# Altium schematic symbol library jlcpcb_2025_04_capacitors_extended_1206.schlib: 2503 symbols (part 3 of 14) (continued)
## 1206N471J500CT
designator C?  Capacitance: 470pF  (hidden comment: *)
Capacitor, Ceramic (MLCC), 470pF, ±5%, 50V, NP0, ±5%, SMD 1206; Manufacturer: Walsin Tech Corp; Manufacturer Part Number: 1206N471J500CT; Package Size: 1206; JLCPCB Basic Part: No; JLCPCB Part Number: C396806; Supplier 1: LCSC; Category: Capacitors - MLCC; Supplier Part Number 1: C396806; Tolerance: ±5%; Voltage Rating: 50V; Temperature Coefficient: NP0; RoHS: Yes; ComponentLink1Description: Datasheet; ComponentLink1URL: https://wmsc.lcsc.com/wmsc/upload/file/pdf/v2/lcsc/2304140030_Walsin-Tech-Corp-1206N471J500CT_C396806.pdf; ComponentLink2Description: JLCPCB Part URL; ComponentLink2URL: https://jlcpcb.com/partdetail/C396806; ComponentLink3Description: LCSC Part URL; ComponentLink3URL: https://lcsc.com/product-detail/Multilayer-Ceramic-Capacitors-MLCC---SMD-SMT_Walsin-Tech-Corp-Walsin-Tech-Corp-1206N471J500CT_C396806.html
footprint CAP-1206 (1206 (3216M) Capacitor)
pins: 1, 2

## 1206N471J501CT
designator C?  Capacitance: 470pF  (hidden comment: *)
Capacitor, Ceramic (MLCC), 470pF, ±5%, 500V, C0G, ±5%, SMD 1206; Manufacturer: Walsin Tech Corp; Manufacturer Part Number: 1206N471J501CT; Package Size: 1206; JLCPCB Basic Part: No; JLCPCB Part Number: C3876989; Supplier 1: LCSC; Category: Capacitors - MLCC; Supplier Part Number 1: C3876989; Tolerance: ±5%; Voltage Rating: 500V; Temperature Coefficient: C0G; RoHS: Yes; ComponentLink1Description: Datasheet; ComponentLink1URL: https://wmsc.lcsc.com/wmsc/upload/file/pdf/v2/lcsc/2401181530_Walsin-Tech-Corp-1206N471J501CT_C3876989.pdf; ComponentLink2Description: JLCPCB Part URL; ComponentLink2URL: https://jlcpcb.com/partdetail/C3876989; ComponentLink3Description: LCSC Part URL; ComponentLink3URL: https://lcsc.com/product-detail/Multilayer-Ceramic-Capacitors-MLCC---SMD-SMT_Walsin-Tech-Corp-Walsin-Tech-Corp-1206N471J501CT_C3876989.html
footprint CAP-1206 (1206 (3216M) Capacitor)
pins: 1, 2

## 1206N471J631CT
designator C?  Capacitance: 470pF  (hidden comment: *)
Capacitor, Ceramic (MLCC), 470pF, ±5%, 630V, NP0, ±5%, SMD 1206; Manufacturer: Walsin Tech Corp; Manufacturer Part Number: 1206N471J631CT; Package Size: 1206; JLCPCB Basic Part: No; JLCPCB Part Number: C509276; Supplier 1: LCSC; Category: Capacitors - MLCC; Supplier Part Number 1: C509276; Tolerance: ±5%; Voltage Rating: 630V; Temperature Coefficient: NP0; RoHS: Yes; ComponentLink1Description: Datasheet; ComponentLink1URL: https://wmsc.lcsc.com/wmsc/upload/file/pdf/v2/lcsc/2304140030_Walsin-Tech-Corp-1206N471J631CT_C509276.pdf; ComponentLink2Description: JLCPCB Part URL; ComponentLink2URL: https://jlcpcb.com/partdetail/C509276; ComponentLink3Description: LCSC Part URL; ComponentLink3URL: https://lcsc.com/product-detail/Multilayer-Ceramic-Capacitors-MLCC---SMD-SMT_Walsin-Tech-Corp-Walsin-Tech-Corp-1206N471J631CT_C509276.html
footprint CAP-1206 (1206 (3216M) Capacitor)
pins: 1, 2

## 1206N472F500CT
designator C?  Capacitance: 4.7nF  (hidden comment: *)
Capacitor, Ceramic (MLCC), 4.7nF, ±1%, 50V, C0G, ±1%, SMD 1206; Manufacturer: Walsin Tech Corp; Manufacturer Part Number: 1206N472F500CT; Package Size: 1206; JLCPCB Basic Part: No; JLCPCB Part Number: C3876583; Supplier 1: LCSC; Category: Capacitors - MLCC; Supplier Part Number 1: C3876583; Tolerance: ±1%; Voltage Rating: 50V; Temperature Coefficient: C0G; RoHS: Yes; ComponentLink1Description: Datasheet; ComponentLink1URL: https://wmsc.lcsc.com/wmsc/upload/file/pdf/v2/lcsc/2401181529_Walsin-Tech-Corp-1206N472F500CT_C3876583.pdf; ComponentLink2Description: JLCPCB Part URL; ComponentLink2URL: https://jlcpcb.com/partdetail/C3876583; ComponentLink3Description: LCSC Part URL; ComponentLink3URL: https://lcsc.com/product-detail/Multilayer-Ceramic-Capacitors-MLCC---SMD-SMT_Walsin-Tech-Corp-Walsin-Tech-Corp-1206N472F500CT_C3876583.html
footprint CAP-1206 (1206 (3216M) Capacitor)
pins: 1, 2

## 1206N472J500CT
designator C?  Capacitance: 4.7nF  (hidden comment: *)
Capacitor, Ceramic (MLCC), 4.7nF, ±5%, 50V, NP0, ±5%, SMD 1206; Manufacturer: Walsin Tech Corp; Manufacturer Part Number: 1206N472J500CT; Package Size: 1206; JLCPCB Basic Part: No; JLCPCB Part Number: C525506; Supplier 1: LCSC; Category: Capacitors - MLCC; Supplier Part Number 1: C525506; Tolerance: ±5%; Voltage Rating: 50V; Temperature Coefficient: NP0; RoHS: Yes; ComponentLink1Description: Datasheet; ComponentLink1URL: https://wmsc.lcsc.com/wmsc/upload/file/pdf/v2/lcsc/2304140030_Walsin-Tech-Corp-1206N472J500CT_C525506.pdf; ComponentLink2Description: JLCPCB Part URL; ComponentLink2URL: https://jlcpcb.com/partdetail/C525506; ComponentLink3Description: LCSC Part URL; ComponentLink3URL: https://lcsc.com/product-detail/Multilayer-Ceramic-Capacitors-MLCC---SMD-SMT_Walsin-Tech-Corp-Walsin-Tech-Corp-1206N472J500CT_C525506.html
footprint CAP-1206 (1206 (3216M) Capacitor)
pins: 1, 2

## 1206N560J102CT
designator C?  Capacitance: 56pF  (hidden comment: *)
Capacitor, Ceramic (MLCC), 56pF, ±5%, 1kV, NP0, ±5%, SMD 1206; Manufacturer: Walsin Tech Corp; Manufacturer Part Number: 1206N560J102CT; Package Size: 1206; JLCPCB Basic Part: No; JLCPCB Part Number: C384717; Supplier 1: LCSC; Category: Capacitors - MLCC; Supplier Part Number 1: C384717; Tolerance: ±5%; Voltage Rating: 1kV; Temperature Coefficient: NP0; RoHS: Yes; ComponentLink1Description: Datasheet; ComponentLink1URL: https://wmsc.lcsc.com/wmsc/upload/file/pdf/v2/lcsc/2304140030_Walsin-Tech-Corp-1206N560J102CT_C384717.pdf; ComponentLink2Description: JLCPCB Part URL; ComponentLink2URL: https://jlcpcb.com/partdetail/C384717; ComponentLink3Description: LCSC Part URL; ComponentLink3URL: https://lcsc.com/product-detail/Multilayer-Ceramic-Capacitors-MLCC---SMD-SMT_Walsin-Tech-Corp-Walsin-Tech-Corp-1206N560J102CT_C384717.html
footprint CAP-1206 (1206 (3216M) Capacitor)
pins: 1, 2

## 1206N560J501CT
designator C?  Capacitance: 56pF  (hidden comment: *)
Capacitor, Ceramic (MLCC), 56pF, ±5%, 500V, NP0, ±5%, SMD 1206; Manufacturer: Walsin Tech Corp; Manufacturer Part Number: 1206N560J501CT; Package Size: 1206; JLCPCB Basic Part: No; JLCPCB Part Number: C152950; Supplier 1: LCSC; Category: Capacitors - MLCC; Supplier Part Number 1: C152950; Tolerance: ±5%; Voltage Rating: 500V; Temperature Coefficient: NP0; RoHS: Yes; ComponentLink1Description: Datasheet; ComponentLink1URL: https://wmsc.lcsc.com/wmsc/upload/file/pdf/v2/lcsc/2304140030_Walsin-Tech-Corp-1206N560J501CT_C152950.pdf; ComponentLink2Description: JLCPCB Part URL; ComponentLink2URL: https://jlcpcb.com/partdetail/C152950; ComponentLink3Description: LCSC Part URL; ComponentLink3URL: https://lcsc.com/product-detail/Multilayer-Ceramic-Capacitors-MLCC---SMD-SMT_Walsin-Tech-Corp-Walsin-Tech-Corp-1206N560J501CT_C152950.html
footprint CAP-1206 (1206 (3216M) Capacitor)
pins: 1, 2

## 1206N561J102CT
designator C?  Capacitance: 560pF  (hidden comment: *)
Capacitor, Ceramic (MLCC), 560pF, ±5%, 1kV, NP0, ±5%, SMD 1206; Manufacturer: Walsin Tech Corp; Manufacturer Part Number: 1206N561J102CT; Package Size: 1206; JLCPCB Basic Part: No; JLCPCB Part Number: C396807; Supplier 1: LCSC; Category: Capacitors - MLCC; Supplier Part Number 1: C396807; Tolerance: ±5%; Voltage Rating: 1kV; Temperature Coefficient: NP0; RoHS: Yes; ComponentLink1Description: Datasheet; ComponentLink1URL: https://wmsc.lcsc.com/wmsc/upload/file/pdf/v2/lcsc/2304140030_Walsin-Tech-Corp-1206N561J102CT_C396807.pdf; ComponentLink2Description: JLCPCB Part URL; ComponentLink2URL: https://jlcpcb.com/partdetail/C396807; ComponentLink3Description: LCSC Part URL; ComponentLink3URL: https://lcsc.com/product-detail/Multilayer-Ceramic-Capacitors-MLCC---SMD-SMT_Walsin-Tech-Corp-Walsin-Tech-Corp-1206N561J102CT_C396807.html
footprint CAP-1206 (1206 (3216M) Capacitor)
pins: 1, 2

## 1206N561J631CT
designator C?  Capacitance: 560pF  (hidden comment: *)
Capacitor, Ceramic (MLCC), 560pF, ±5%, 630V, NP0, ±5%, SMD 1206; Manufacturer: Walsin Tech Corp; Manufacturer Part Number: 1206N561J631CT; Package Size: 1206; JLCPCB Basic Part: No; JLCPCB Part Number: C2894199; Supplier 1: LCSC; Category: Capacitors - MLCC; Supplier Part Number 1: C2894199; Tolerance: ±5%; Voltage Rating: 630V; Temperature Coefficient: NP0; RoHS: Yes; ComponentLink1Description: Datasheet; ComponentLink1URL: https://wmsc.lcsc.com/wmsc/upload/file/pdf/v2/lcsc/2109081830_Walsin-Tech-Corp-1206N561J631CT_C2894199.pdf; ComponentLink2Description: JLCPCB Part URL; ComponentLink2URL: https://jlcpcb.com/partdetail/C2894199; ComponentLink3Description: LCSC Part URL; ComponentLink3URL: https://lcsc.com/product-detail/Multilayer-Ceramic-Capacitors-MLCC---SMD-SMT_Walsin-Tech-Corp-Walsin-Tech-Corp-1206N561J631CT_C2894199.html
footprint CAP-1206 (1206 (3216M) Capacitor)
pins: 1, 2

## 1206N680J102CT
designator C?  Capacitance: 68pF  (hidden comment: *)
Capacitor, Ceramic (MLCC), 68pF, ±5%, 1kV, NP0, ±5%, SMD 1206; Manufacturer: Walsin Tech Corp; Manufacturer Part Number: 1206N680J102CT; Package Size: 1206; JLCPCB Basic Part: No; JLCPCB Part Number: C303970; Supplier 1: LCSC; Category: Capacitors - MLCC; Supplier Part Number 1: C303970; Tolerance: ±5%; Voltage Rating: 1kV; Temperature Coefficient: NP0; RoHS: Yes; ComponentLink1Description: Datasheet; ComponentLink1URL: https://wmsc.lcsc.com/wmsc/upload/file/pdf/v2/lcsc/2304231850_Walsin-Tech-Corp-1206N680J102CT_C303970.pdf; ComponentLink2Description: JLCPCB Part URL; ComponentLink2URL: https://jlcpcb.com/partdetail/C303970; ComponentLink3Description: LCSC Part URL; ComponentLink3URL: https://lcsc.com/product-detail/Multilayer-Ceramic-Capacitors-MLCC---SMD-SMT_Walsin-Tech-Corp-Walsin-Tech-Corp-1206N680J102CT_C303970.html
footprint CAP-1206 (1206 (3216M) Capacitor)
pins: 1, 2

## 1206N680J201CT
designator C?  Capacitance: 68pF  (hidden comment: *)
Capacitor, Ceramic (MLCC), 68pF, ±5%, 200V, NP0, ±5%, SMD 1206; Manufacturer: Walsin Tech Corp; Manufacturer Part Number: 1206N680J201CT; Package Size: 1206; JLCPCB Basic Part: No; JLCPCB Part Number: C396808; Supplier 1: LCSC; Category: Capacitors - MLCC; Supplier Part Number 1: C396808; Tolerance: ±5%; Voltage Rating: 200V; Temperature Coefficient: NP0; RoHS: Yes; ComponentLink1Description: Datasheet; ComponentLink1URL: https://wmsc.lcsc.com/wmsc/upload/file/pdf/v2/lcsc/2304140030_Walsin-Tech-Corp-1206N680J201CT_C396808.pdf; ComponentLink2Description: JLCPCB Part URL; ComponentLink2URL: https://jlcpcb.com/partdetail/C396808; ComponentLink3Description: LCSC Part URL; ComponentLink3URL: https://lcsc.com/product-detail/Multilayer-Ceramic-Capacitors-MLCC---SMD-SMT_Walsin-Tech-Corp-Walsin-Tech-Corp-1206N680J201CT_C396808.html
footprint CAP-1206 (1206 (3216M) Capacitor)
pins: 1, 2

## 1206N680J202CT
designator C?  Capacitance: 68pF  (hidden comment: *)
Capacitor, Ceramic (MLCC), 68pF, ±5%, 2kV, NP0, ±5%, SMD 1206; Manufacturer: Walsin Tech Corp; Manufacturer Part Number: 1206N680J202CT; Package Size: 1206; JLCPCB Basic Part: No; JLCPCB Part Number: C77531; Supplier 1: LCSC; Category: Capacitors - MLCC; Supplier Part Number 1: C77531; Tolerance: ±5%; Voltage Rating: 2kV; Temperature Coefficient: NP0; RoHS: Yes; ComponentLink1Description: Datasheet; ComponentLink2Description: JLCPCB Part URL; ComponentLink2URL: https://jlcpcb.com/partdetail/C77531; ComponentLink3Description: LCSC Part URL; ComponentLink3URL: https://lcsc.com/product-detail/Multilayer-Ceramic-Capacitors-MLCC---SMD-SMT_Walsin-Tech-Corp-Walsin-Tech-Corp-1206N680J202CT_C77531.html
footprint CAP-1206 (1206 (3216M) Capacitor)
pins: 1, 2

## 1206N680J500CT
designator C?  Capacitance: 68pF  (hidden comment: *)
Capacitor, Ceramic (MLCC), 68pF, ±5%, 50V, NP0, ±5%, SMD 1206; Manufacturer: Walsin Tech Corp; Manufacturer Part Number: 1206N680J500CT; Package Size: 1206; JLCPCB Basic Part: No; JLCPCB Part Number: C237230; Supplier 1: LCSC; Category: Capacitors - MLCC; Supplier Part Number 1: C237230; Tolerance: ±5%; Voltage Rating: 50V; Temperature Coefficient: NP0; RoHS: Yes; ComponentLink1Description: Datasheet; ComponentLink1URL: https://wmsc.lcsc.com/wmsc/upload/file/pdf/v2/lcsc/2304140030_Walsin-Tech-Corp-1206N680J500CT_C237230.pdf; ComponentLink2Description: JLCPCB Part URL; ComponentLink2URL: https://jlcpcb.com/partdetail/C237230; ComponentLink3Description: LCSC Part URL; ComponentLink3URL: https://lcsc.com/product-detail/Multilayer-Ceramic-Capacitors-MLCC---SMD-SMT_Walsin-Tech-Corp-Walsin-Tech-Corp-1206N680J500CT_C237230.html
footprint CAP-1206 (1206 (3216M) Capacitor)
pins: 1, 2

## 1206N681J102CT
designator C?  Capacitance: 680pF  (hidden comment: *)
Capacitor, Ceramic (MLCC), 680pF, ±5%, 1kV, NP0, ±5%, SMD 1206; Manufacturer: Walsin Tech Corp; Manufacturer Part Number: 1206N681J102CT; Package Size: 1206; JLCPCB Basic Part: No; JLCPCB Part Number: C384716; Supplier 1: LCSC; Category: Capacitors - MLCC; Supplier Part Number 1: C384716; Tolerance: ±5%; Voltage Rating: 1kV; Temperature Coefficient: NP0; RoHS: Yes; ComponentLink1Description: Datasheet; ComponentLink1URL: https://wmsc.lcsc.com/wmsc/upload/file/pdf/v2/lcsc/2304140030_Walsin-Tech-Corp-1206N681J102CT_C384716.pdf; ComponentLink2Description: JLCPCB Part URL; ComponentLink2URL: https://jlcpcb.com/partdetail/C384716; ComponentLink3Description: LCSC Part URL; ComponentLink3URL: https://lcsc.com/product-detail/Multilayer-Ceramic-Capacitors-MLCC---SMD-SMT_Walsin-Tech-Corp-Walsin-Tech-Corp-1206N681J102CT_C384716.html
footprint CAP-1206 (1206 (3216M) Capacitor)
pins: 1, 2

## 1206N681J501CT
designator C?  Capacitance: 680pF  (hidden comment: *)
Capacitor, Ceramic (MLCC), 680pF, ±5%, 500V, C0G, ±5%, SMD 1206; Manufacturer: Walsin Tech Corp; Manufacturer Part Number: 1206N681J501CT; Package Size: 1206; JLCPCB Basic Part: No; JLCPCB Part Number: C3832856; Supplier 1: LCSC; Category: Capacitors - MLCC; Supplier Part Number 1: C3832856; Tolerance: ±5%; Voltage Rating: 500V; Temperature Coefficient: C0G; RoHS: Yes; ComponentLink1Description: Datasheet; ComponentLink1URL: https://wmsc.lcsc.com/wmsc/upload/file/pdf/v2/lcsc/2401181513_Walsin-Tech-Corp-1206N681J501CT_C3832856.pdf; ComponentLink2Description: JLCPCB Part URL; ComponentLink2URL: https://jlcpcb.com/partdetail/C3832856; ComponentLink3Description: LCSC Part URL; ComponentLink3URL: https://lcsc.com/product-detail/Multilayer-Ceramic-Capacitors-MLCC---SMD-SMT_Walsin-Tech-Corp-Walsin-Tech-Corp-1206N681J501CT_C3832856.html
footprint CAP-1206 (1206 (3216M) Capacitor)
pins: 1, 2

## 1206N820J102CT
designator C?  Capacitance: 82pF  (hidden comment: *)
Capacitor, Ceramic (MLCC), 82pF, ±5%, 1kV, NP0, ±5%, SMD 1206; Manufacturer: Walsin Tech Corp; Manufacturer Part Number: 1206N820J102CT; Package Size: 1206; JLCPCB Basic Part: No; JLCPCB Part Number: C396810; Supplier 1: LCSC; Category: Capacitors - MLCC; Supplier Part Number 1: C396810; Tolerance: ±5%; Voltage Rating: 1kV; Temperature Coefficient: NP0; RoHS: Yes; ComponentLink1Description: Datasheet; ComponentLink1URL: https://wmsc.lcsc.com/wmsc/upload/file/pdf/v2/lcsc/2304140030_Walsin-Tech-Corp-1206N820J102CT_C396810.pdf; ComponentLink2Description: JLCPCB Part URL; ComponentLink2URL: https://jlcpcb.com/partdetail/C396810; ComponentLink3Description: LCSC Part URL; ComponentLink3URL: https://lcsc.com/product-detail/Multilayer-Ceramic-Capacitors-MLCC---SMD-SMT_Walsin-Tech-Corp-Walsin-Tech-Corp-1206N820J102CT_C396810.html
footprint CAP-1206 (1206 (3216M) Capacitor)
pins: 1, 2

## 1206N822J500CT
designator C?  Capacitance: 8.2nF  (hidden comment: *)
Capacitor, Ceramic (MLCC), 8.2nF, ±5%, 50V, NP0, ±5%, SMD 1206; Manufacturer: Walsin Tech Corp; Manufacturer Part Number: 1206N822J500CT; Package Size: 1206; JLCPCB Basic Part: No; JLCPCB Part Number: C303971; Supplier 1: LCSC; Category: Capacitors - MLCC; Supplier Part Number 1: C303971; Tolerance: ±5%; Voltage Rating: 50V; Temperature Coefficient: NP0; RoHS: Yes; ComponentLink1Description: Datasheet; ComponentLink1URL: https://wmsc.lcsc.com/wmsc/upload/file/pdf/v2/lcsc/2304140030_Walsin-Tech-Corp-1206N822J500CT_C303971.pdf; ComponentLink2Description: JLCPCB Part URL; ComponentLink2URL: https://jlcpcb.com/partdetail/C303971; ComponentLink3Description: LCSC Part URL; ComponentLink3URL: https://lcsc.com/product-detail/Multilayer-Ceramic-Capacitors-MLCC---SMD-SMT_Walsin-Tech-Corp-Walsin-Tech-Corp-1206N822J500CT_C303971.html
footprint CAP-1206 (1206 (3216M) Capacitor)
pins: 1, 2

## 1206X106K6R3NT
designator C?  Capacitance: 10uF  (hidden comment: *)
Capacitor, Ceramic (MLCC), 10uF, ±10%, 6.3V, X5R, ±10%, SMD 1206; Manufacturer: FH (Guangdong Fenghua Advanced Tech); Manufacturer Part Number: 1206X106K6R3NT; Package Size: 1206; JLCPCB Basic Part: No; JLCPCB Part Number: C3037669; Supplier 1: LCSC; Category: Capacitors - MLCC; Supplier Part Number 1: C3037669; Tolerance: ±10%; Voltage Rating: 6.3V; Temperature Coefficient: X5R; RoHS: Yes; ComponentLink1Description: Datasheet; ComponentLink1URL: https://wmsc.lcsc.com/wmsc/upload/file/pdf/v2/lcsc/2206171645_FH--Guangdong-Fenghua-Advanced-Tech-1206X106K6R3NT_C3037669.pdf; ComponentLink2Description: JLCPCB Part URL; ComponentLink2URL: https://jlcpcb.com/partdetail/C3037669; ComponentLink3Description: LCSC Part URL; ComponentLink3URL: https://lcsc.com/product-detail/Multilayer-Ceramic-Capacitors-MLCC---SMD-SMT_FH-Guangdong-Fenghua-Advanced-Tech-FH-Guangdong-Fenghua-Advanced-Tech-1206X106K6R3NT_C3037669.html
footprint CAP-1206 (1206 (3216M) Capacitor)
pins: 1, 2

## 1206X106K100
designator C?  Capacitance: 10uF  (hidden comment: *)
Capacitor, Ceramic (MLCC), 10uF, ±10%, 10V, X5R, ±10%, SMD 1206; Manufacturer: Walsin Tech Corp; Manufacturer Part Number: 1206X106K100; Package Size: 1206; JLCPCB Basic Part: No; JLCPCB Part Number: C152991; Supplier 1: LCSC; Category: Capacitors - MLCC; Supplier Part Number 1: C152991; Tolerance: ±10%; Voltage Rating: 10V; Temperature Coefficient: X5R; RoHS: Yes; ComponentLink1Description: Datasheet; ComponentLink1URL: https://wmsc.lcsc.com/wmsc/upload/file/pdf/v2/lcsc/2304140030_Walsin-Tech-Corp-1206X106K100_C152991.pdf; ComponentLink2Description: JLCPCB Part URL; ComponentLink2URL: https://jlcpcb.com/partdetail/C152991; ComponentLink3Description: LCSC Part URL; ComponentLink3URL: https://lcsc.com/product-detail/Multilayer-Ceramic-Capacitors-MLCC---SMD-SMT_Walsin-Tech-Corp-Walsin-Tech-Corp-1206X106K100_C152991.html
footprint CAP-1206 (1206 (3216M) Capacitor)
pins: 1, 2

## 1206X106K100CT
designator C?  Capacitance: 10uF  (hidden comment: *)
Capacitor, Ceramic (MLCC), 10uF, ±10%, 10V, X5R, ±10%, SMD 1206; Manufacturer: Walsin Tech Corp; Manufacturer Part Number: 1206X106K100CT; Package Size: 1206; JLCPCB Basic Part: No; JLCPCB Part Number: C304002; Supplier 1: LCSC; Category: Capacitors - MLCC; Supplier Part Number 1: C304002; Tolerance: ±10%; Voltage Rating: 10V; Temperature Coefficient: X5R; RoHS: Yes; ComponentLink1Description: Datasheet; ComponentLink1URL: https://wmsc.lcsc.com/wmsc/upload/file/pdf/v2/lcsc/2304140030_Walsin-Tech-Corp-1206X106K100CT_C304002.pdf; ComponentLink2Description: JLCPCB Part URL; ComponentLink2URL: https://jlcpcb.com/partdetail/C304002; ComponentLink3Description: LCSC Part URL; ComponentLink3URL: https://lcsc.com/product-detail/Multilayer-Ceramic-Capacitors-MLCC---SMD-SMT_Walsin-Tech-Corp-Walsin-Tech-Corp-1206X106K100CT_C304002.html
footprint CAP-1206 (1206 (3216M) Capacitor)
pins: 1, 2

## 1206X106K100NT
designator C?  Capacitance: 10uF  (hidden comment: *)
Capacitor, Ceramic (MLCC), 10uF, ±10%, 10V, X5R, ±10%, SMD 1206; Manufacturer: FH(Guangdong Fenghua Advanced Tech); Manufacturer Part Number: 1206X106K100NT; Package Size: 1206; JLCPCB Basic Part: No; JLCPCB Part Number: C157351; Supplier 1: LCSC; Category: Capacitors - MLCC; Supplier Part Number 1: C157351; Tolerance: ±10%; Voltage Rating: 10V; Temperature Coefficient: X5R; RoHS: Yes; ComponentLink1Description: Datasheet; ComponentLink1URL: https://wmsc.lcsc.com/wmsc/upload/file/pdf/v2/lcsc/2304140030_FH--Guangdong-Fenghua-Advanced-Tech-1206X106K100NT_C157351.pdf; ComponentLink2Description: JLCPCB Part URL; ComponentLink2URL: https://jlcpcb.com/partdetail/C157351; ComponentLink3Description: LCSC Part URL; ComponentLink3URL: https://lcsc.com/product-detail/Multilayer-Ceramic-Capacitors-MLCC---SMD-SMT_FH-Guangdong-Fenghua-Advanced-Tech-FH-Guangdong-Fenghua-Advanced-Tech-1206X106K100NT_C157351.html
footprint CAP-1206 (1206 (3216M) Capacitor)
pins: 1, 2

## 1206X106K160CT_C304003
designator C?  Capacitance: 10uF  (hidden comment: *)
Capacitor, Ceramic (MLCC), 10uF, ±10%, 16V, X5R, ±10%, SMD 1206; Manufacturer: Walsin Tech Corp; Manufacturer Part Number: 1206X106K160CT; Package Size: 1206; JLCPCB Basic Part: No; JLCPCB Part Number: C304003; Supplier 1: LCSC; Category: Capacitors - MLCC; Supplier Part Number 1: C304003; Tolerance: ±10%; Voltage Rating: 16V; Temperature Coefficient: X5R; RoHS: Yes; ComponentLink1Description: Datasheet; ComponentLink1URL: https://wmsc.lcsc.com/wmsc/upload/file/pdf/v2/lcsc/2304140030_Walsin-Tech-Corp-1206X106K160CT_C304003.pdf; ComponentLink2Description: JLCPCB Part URL; ComponentLink2URL: https://jlcpcb.com/partdetail/C304003; ComponentLink3Description: LCSC Part URL; ComponentLink3URL: https://lcsc.com/product-detail/Multilayer-Ceramic-Capacitors-MLCC---SMD-SMT_Walsin-Tech-Corp-Walsin-Tech-Corp-1206X106K160CT_C304003.html
footprint CAP-1206 (1206 (3216M) Capacitor)
pins: 1, 2

## 1206X106K160CT_C5122255
designator C?  Capacitance: 10uF  (hidden comment: *)
Capacitor, Ceramic (MLCC), 10uF, ±10%, 16V, X5R, ±10%, SMD 1206; Manufacturer: Walsin Tech Corp; Manufacturer Part Number: 1206X106K160CT; Package Size: 1206; JLCPCB Basic Part: No; JLCPCB Part Number: C5122255; Supplier 1: LCSC; Category: Capacitors - MLCC; Supplier Part Number 1: C5122255; Tolerance: ±10%; Voltage Rating: 16V; Temperature Coefficient: X5R; RoHS: Yes; ComponentLink1Description: Datasheet; ComponentLink1URL: https://wmsc.lcsc.com/wmsc/upload/file/pdf/v2/lcsc/2208151830_Walsin-Tech-Corp-1206X106K160CT_C5122255.pdf; ComponentLink2Description: JLCPCB Part URL; ComponentLink2URL: https://jlcpcb.com/partdetail/C5122255; ComponentLink3Description: LCSC Part URL; ComponentLink3URL: https://lcsc.com/product-detail/Multilayer-Ceramic-Capacitors-MLCC---SMD-SMT_Walsin-Tech-Corp-Walsin-Tech-Corp-1206X106K160CT_C5122255.html
footprint CAP-1206 (1206 (3216M) Capacitor)
pins: 1, 2

## 1206X106K160NT
designator C?  Capacitance: 10uF  (hidden comment: *)
Capacitor, Ceramic (MLCC), 10uF, ±10%, 16V, X5R, ±10%, SMD 1206; Manufacturer: FH(Guangdong Fenghua Advanced Tech); Manufacturer Part Number: 1206X106K160NT; Package Size: 1206; JLCPCB Basic Part: No; JLCPCB Part Number: C105478; Supplier 1: LCSC; Category: Capacitors - MLCC; Supplier Part Number 1: C105478; Tolerance: ±10%; Voltage Rating: 16V; Temperature Coefficient: X5R; RoHS: Yes; ComponentLink1Description: Datasheet; ComponentLink1URL: https://wmsc.lcsc.com/wmsc/upload/file/pdf/v2/lcsc/2304140030_FH--Guangdong-Fenghua-Advanced-Tech-1206X106K160NT_C105478.pdf; ComponentLink2Description: JLCPCB Part URL; ComponentLink2URL: https://jlcpcb.com/partdetail/C105478; ComponentLink3Description: LCSC Part URL; ComponentLink3URL: https://lcsc.com/product-detail/Multilayer-Ceramic-Capacitors-MLCC---SMD-SMT_FH-Guangdong-Fenghua-Advanced-Tech-FH-Guangdong-Fenghua-Advanced-Tech-1206X106K160NT_C105478.html
footprint CAP-1206 (1206 (3216M) Capacitor)
pins: 1, 2

## 1206X106K250CT
designator C?  Capacitance: 10uF  (hidden comment: *)
Capacitor, Ceramic (MLCC), 10uF, 25V, X5R, SMD 1206; Manufacturer: Walsin Tech Corp; Manufacturer Part Number: 1206X106K250CT; Package Size: 1206; JLCPCB Basic Part: No; JLCPCB Part Number: C5122252; Supplier 1: LCSC; Category: Capacitors - MLCC; Supplier Part Number 1: C5122252; Voltage Rating: 25V; Temperature Coefficient: X5R; RoHS: Yes; ComponentLink1Description: Datasheet; ComponentLink1URL: https://wmsc.lcsc.com/wmsc/upload/file/pdf/v2/lcsc/2208151830_Walsin-Tech-Corp-1206X106K250CT_C5122252.pdf; ComponentLink2Description: JLCPCB Part URL; ComponentLink2URL: https://jlcpcb.com/partdetail/C5122252; ComponentLink3Description: LCSC Part URL; ComponentLink3URL: https://lcsc.com/product-detail/Multilayer-Ceramic-Capacitors-MLCC---SMD-SMT_Walsin-Tech-Corp-Walsin-Tech-Corp-1206X106K250CT_C5122252.html
footprint CAP-1206 (1206 (3216M) Capacitor)
pins: 1, 2

## 1206X106K250NT
designator C?  Capacitance: 10uF  (hidden comment: *)
Capacitor, Ceramic (MLCC), 10uF, ±10%, 25V, X5R, ±10%, SMD 1206; Manufacturer: FH(Guangdong Fenghua Advanced Tech); Manufacturer Part Number: 1206X106K250NT; Package Size: 1206; JLCPCB Basic Part: No; JLCPCB Part Number: C105482; Supplier 1: LCSC; Category: Capacitors - MLCC; Supplier Part Number 1: C105482; Tolerance: ±10%; Voltage Rating: 25V; Temperature Coefficient: X5R; RoHS: Yes; ComponentLink1Description: Datasheet; ComponentLink1URL: https://wmsc.lcsc.com/wmsc/upload/file/pdf/v2/lcsc/2304140030_FH--Guangdong-Fenghua-Advanced-Tech-1206X106K250NT_C105482.pdf; ComponentLink2Description: JLCPCB Part URL; ComponentLink2URL: https://jlcpcb.com/partdetail/C105482; ComponentLink3Description: LCSC Part URL; ComponentLink3URL: https://lcsc.com/product-detail/Multilayer-Ceramic-Capacitors-MLCC---SMD-SMT_FH-Guangdong-Fenghua-Advanced-Tech-FH-Guangdong-Fenghua-Advanced-Tech-1206X106K250NT_C105482.html
footprint CAP-1206 (1206 (3216M) Capacitor)
pins: 1, 2

## 1206X106K500CT
designator C?  Capacitance: 10uF  (hidden comment: *)
Capacitor, Ceramic (MLCC), 10uF, ±10%, 50V, X5R, ±10%, SMD 1206; Manufacturer: Walsin Tech Corp; Manufacturer Part Number: 1206X106K500CT; Package Size: 1206; JLCPCB Basic Part: No; JLCPCB Part Number: C89835; Supplier 1: LCSC; Category: Capacitors - MLCC; Supplier Part Number 1: C89835; Tolerance: ±10%; Voltage Rating: 50V; Temperature Coefficient: X5R; RoHS: Yes; ComponentLink1Description: Datasheet; ComponentLink1URL: https://wmsc.lcsc.com/wmsc/upload/file/pdf/v2/lcsc/2304140030_Walsin-Tech-Corp-1206X106K500CT_C89835.pdf; ComponentLink2Description: JLCPCB Part URL; ComponentLink2URL: https://jlcpcb.com/partdetail/C89835; ComponentLink3Description: LCSC Part URL; ComponentLink3URL: https://lcsc.com/product-detail/Multilayer-Ceramic-Capacitors-MLCC---SMD-SMT_Walsin-Tech-Corp-Walsin-Tech-Corp-1206X106K500CT_C89835.html
footprint CAP-1206 (1206 (3216M) Capacitor)
pins: 1, 2

## 1206X106K500NT
designator C?  Capacitance: 10uF  (hidden comment: *)
Capacitor, Ceramic (MLCC), 10uF, ±10%, 50V, X5R, ±10%, SMD 1206; Manufacturer: FH(Guangdong Fenghua Advanced Tech); Manufacturer Part Number: 1206X106K500NT; Package Size: 1206; JLCPCB Basic Part: No; JLCPCB Part Number: C116702; Supplier 1: LCSC; Category: Capacitors - MLCC; Supplier Part Number 1: C116702; Tolerance: ±10%; Voltage Rating: 50V; Temperature Coefficient: X5R; RoHS: Yes; ComponentLink1Description: Datasheet; ComponentLink1URL: https://wmsc.lcsc.com/wmsc/upload/file/pdf/v2/lcsc/2304140030_FH--Guangdong-Fenghua-Advanced-Tech-1206X106K500NT_C116702.pdf; ComponentLink2Description: JLCPCB Part URL; ComponentLink2URL: https://jlcpcb.com/partdetail/C116702; ComponentLink3Description: LCSC Part URL; ComponentLink3URL: https://lcsc.com/product-detail/Multilayer-Ceramic-Capacitors-MLCC---SMD-SMT_FH-Guangdong-Fenghua-Advanced-Tech-FH-Guangdong-Fenghua-Advanced-Tech-1206X106K500NT_C116702.html
footprint CAP-1206 (1206 (3216M) Capacitor)
pins: 1, 2

## 1206X106M250NT
designator C?  Capacitance: 10uF  (hidden comment: *)
Capacitor, Ceramic (MLCC), 10uF, ±20%, 25V, X5R, ±20%, SMD 1206; Manufacturer: FH(Guangdong Fenghua Advanced Tech); Manufacturer Part Number: 1206X106M250NT; Package Size: 1206; JLCPCB Basic Part: No; JLCPCB Part Number: C93059; Supplier 1: LCSC; Category: Capacitors - MLCC; Supplier Part Number 1: C93059; Tolerance: ±20%; Voltage Rating: 25V; Temperature Coefficient: X5R; RoHS: Yes; ComponentLink1Description: Datasheet; ComponentLink1URL: https://wmsc.lcsc.com/wmsc/upload/file/pdf/v2/lcsc/2304140030_FH--Guangdong-Fenghua-Advanced-Tech-1206X106M250NT_C93059.pdf; ComponentLink2Description: JLCPCB Part URL; ComponentLink2URL: https://jlcpcb.com/partdetail/C93059; ComponentLink3Description: LCSC Part URL; ComponentLink3URL: https://lcsc.com/product-detail/Multilayer-Ceramic-Capacitors-MLCC---SMD-SMT_FH-Guangdong-Fenghua-Advanced-Tech-FH-Guangdong-Fenghua-Advanced-Tech-1206X106M250NT_C93059.html
footprint CAP-1206 (1206 (3216M) Capacitor)
pins: 1, 2

## 1206X106M500NT
designator C?  Capacitance: 10uF  (hidden comment: *)
Capacitor, Ceramic (MLCC), 10uF, ±20%, 50V, X5R, ±20%, SMD 1206; Manufacturer: FH(Guangdong Fenghua Advanced Tech); Manufacturer Part Number: 1206X106M500NT; Package Size: 1206; JLCPCB Basic Part: No; JLCPCB Part Number: C170075; Supplier 1: LCSC; Category: Capacitors - MLCC; Supplier Part Number 1: C170075; Tolerance: ±20%; Voltage Rating: 50V; Temperature Coefficient: X5R; RoHS: Yes; ComponentLink1Description: Datasheet; ComponentLink1URL: https://wmsc.lcsc.com/wmsc/upload/file/pdf/v2/lcsc/2304140030_FH--Guangdong-Fenghua-Advanced-Tech-1206X106M500NT_C170075.pdf; ComponentLink2Description: JLCPCB Part URL; ComponentLink2URL: https://jlcpcb.com/partdetail/C170075; ComponentLink3Description: LCSC Part URL; ComponentLink3URL: https://lcsc.com/product-detail/Multilayer-Ceramic-Capacitors-MLCC---SMD-SMT_FH-Guangdong-Fenghua-Advanced-Tech-FH-Guangdong-Fenghua-Advanced-Tech-1206X106M500NT_C170075.html
footprint CAP-1206 (1206 (3216M) Capacitor)
pins: 1, 2

## 1206X107M6R3CT
designator C?  Capacitance: 100uF  (hidden comment: *)
Capacitor, Ceramic (MLCC), 100uF, ±20%, 6.3V, X5R, ±20%, SMD 1206; Manufacturer: Walsin Tech Corp; Manufacturer Part Number: 1206X107M6R3CT; Package Size: 1206; JLCPCB Basic Part: No; JLCPCB Part Number: C98820; Supplier 1: LCSC; Category: Capacitors - MLCC; Supplier Part Number 1: C98820; Tolerance: ±20%; Voltage Rating: 6.3V; Temperature Coefficient: X5R; RoHS: Yes; ComponentLink1Description: Datasheet; ComponentLink1URL: https://wmsc.lcsc.com/wmsc/upload/file/pdf/v2/lcsc/2304140030_Walsin-Tech-Corp-1206X107M6R3CT_C98820.pdf; ComponentLink2Description: JLCPCB Part URL; ComponentLink2URL: https://jlcpcb.com/partdetail/C98820; ComponentLink3Description: LCSC Part URL; ComponentLink3URL: https://lcsc.com/product-detail/Multilayer-Ceramic-Capacitors-MLCC---SMD-SMT_Walsin-Tech-Corp-Walsin-Tech-Corp-1206X107M6R3CT_C98820.html
footprint CAP-1206 (1206 (3216M) Capacitor)
pins: 1, 2

## 1206X107M6R3NT
designator C?  Capacitance: 100uF  (hidden comment: *)
Capacitor, Ceramic (MLCC), 100uF, ±20%, 6.3V, X5R, ±20%, SMD 1206; Manufacturer: FH(Guangdong Fenghua Advanced Tech); Manufacturer Part Number: 1206X107M6R3NT; Package Size: 1206; JLCPCB Basic Part: No; JLCPCB Part Number: C178304; Supplier 1: LCSC; Category: Capacitors - MLCC; Supplier Part Number 1: C178304; Tolerance: ±20%; Voltage Rating: 6.3V; Temperature Coefficient: X5R; RoHS: Yes; ComponentLink1Description: Datasheet; ComponentLink1URL: https://wmsc.lcsc.com/wmsc/upload/file/pdf/v2/lcsc/2304140030_FH--Guangdong-Fenghua-Advanced-Tech-1206X107M6R3NT_C178304.pdf; ComponentLink2Description: JLCPCB Part URL; ComponentLink2URL: https://jlcpcb.com/partdetail/C178304; ComponentLink3Description: LCSC Part URL; ComponentLink3URL: https://lcsc.com/product-detail/Multilayer-Ceramic-Capacitors-MLCC---SMD-SMT_FH-Guangdong-Fenghua-Advanced-Tech-FH-Guangdong-Fenghua-Advanced-Tech-1206X107M6R3NT_C178304.html
footprint CAP-1206 (1206 (3216M) Capacitor)
pins: 1, 2

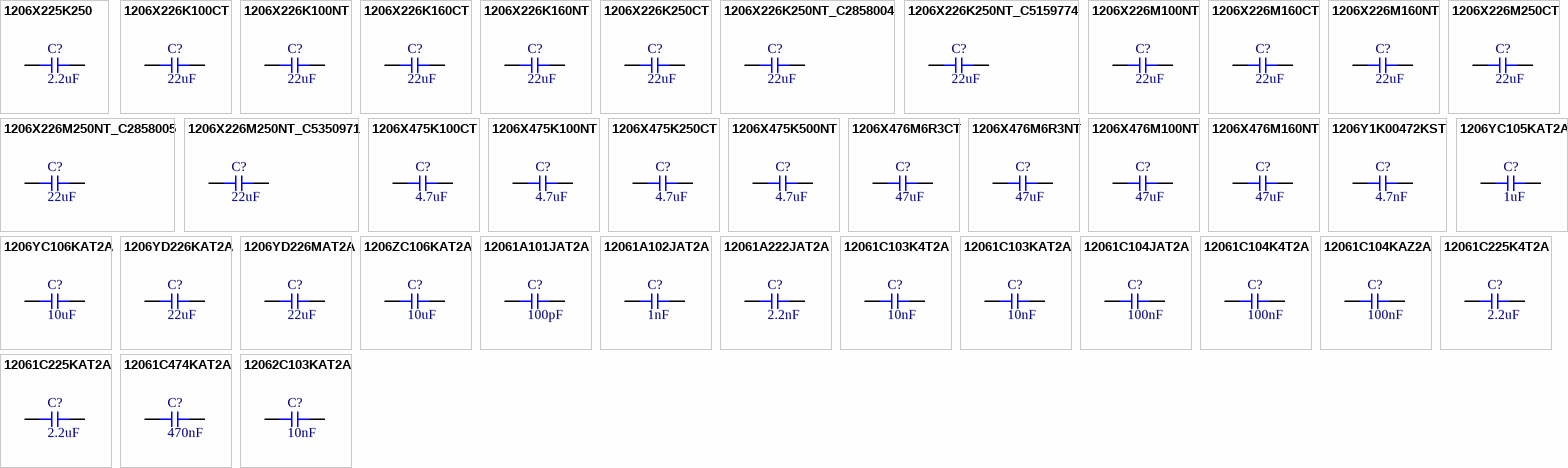
[diagram p13: symbols 1206X225K250 to 12062C103KAT2A]

## 1206X225K250
designator C?  Capacitance: 2.2uF  (hidden comment: *)
Capacitor, Ceramic (MLCC), 2.2uF, ±10%, 25V, X5R, ±10%, SMD 1206; Manufacturer: Walsin Tech Corp; Manufacturer Part Number: 1206X225K250; Package Size: 1206; JLCPCB Basic Part: No; JLCPCB Part Number: C152949; Supplier 1: LCSC; Category: Capacitors - MLCC; Supplier Part Number 1: C152949; Tolerance: ±10%; Voltage Rating: 25V; Temperature Coefficient: X5R; RoHS: Yes; ComponentLink1Description: Datasheet; ComponentLink1URL: https://wmsc.lcsc.com/wmsc/upload/file/pdf/v2/lcsc/2304140030_Walsin-Tech-Corp-1206X225K250_C152949.pdf; ComponentLink2Description: JLCPCB Part URL; ComponentLink2URL: https://jlcpcb.com/partdetail/C152949; ComponentLink3Description: LCSC Part URL; ComponentLink3URL: https://lcsc.com/product-detail/Multilayer-Ceramic-Capacitors-MLCC---SMD-SMT_Walsin-Tech-Corp-Walsin-Tech-Corp-1206X225K250_C152949.html
footprint CAP-1206 (1206 (3216M) Capacitor)
pins: 1, 2

## 1206X226K100CT
designator C?  Capacitance: 22uF  (hidden comment: *)
Capacitor, Ceramic (MLCC), 22uF, ±10%, 10V, X5R, ±10%, SMD 1206; Manufacturer: Walsin Tech Corp; Manufacturer Part Number: 1206X226K100CT; Package Size: 1206; JLCPCB Basic Part: No; JLCPCB Part Number: C304004; Supplier 1: LCSC; Category: Capacitors - MLCC; Supplier Part Number 1: C304004; Tolerance: ±10%; Voltage Rating: 10V; Temperature Coefficient: X5R; RoHS: Yes; ComponentLink1Description: Datasheet; ComponentLink1URL: https://wmsc.lcsc.com/wmsc/upload/file/pdf/v2/lcsc/2304140030_Walsin-Tech-Corp-1206X226K100CT_C304004.pdf; ComponentLink2Description: JLCPCB Part URL; ComponentLink2URL: https://jlcpcb.com/partdetail/C304004; ComponentLink3Description: LCSC Part URL; ComponentLink3URL: https://lcsc.com/product-detail/Multilayer-Ceramic-Capacitors-MLCC---SMD-SMT_Walsin-Tech-Corp-Walsin-Tech-Corp-1206X226K100CT_C304004.html
footprint CAP-1206 (1206 (3216M) Capacitor)
pins: 1, 2

## 1206X226K100NT
designator C?  Capacitance: 22uF  (hidden comment: *)
Capacitor, Ceramic (MLCC), 22uF, ±10%, 10V, X5R, ±10%, SMD 1206; Manufacturer: FH(Guangdong Fenghua Advanced Tech); Manufacturer Part Number: 1206X226K100NT; Package Size: 1206; JLCPCB Basic Part: No; JLCPCB Part Number: C1859; Supplier 1: LCSC; Category: Capacitors - MLCC; Supplier Part Number 1: C1859; Tolerance: ±10%; Voltage Rating: 10V; Temperature Coefficient: X5R; RoHS: Yes; ComponentLink1Description: Datasheet; ComponentLink1URL: https://wmsc.lcsc.com/wmsc/upload/file/pdf/v2/lcsc/2304140030_FH--Guangdong-Fenghua-Advanced-Tech-1206X226K100NT_C1859.pdf; ComponentLink2Description: JLCPCB Part URL; ComponentLink2URL: https://jlcpcb.com/partdetail/C1859; ComponentLink3Description: LCSC Part URL; ComponentLink3URL: https://lcsc.com/product-detail/Multilayer-Ceramic-Capacitors-MLCC---SMD-SMT_FH-Guangdong-Fenghua-Advanced-Tech-FH-Guangdong-Fenghua-Advanced-Tech-1206X226K100NT_C1859.html
footprint CAP-1206 (1206 (3216M) Capacitor)
pins: 1, 2

## 1206X226K160CT
designator C?  Capacitance: 22uF  (hidden comment: *)
Capacitor, Ceramic (MLCC), 22uF, X5R, SMD 1206; Manufacturer: Walsin Tech Corp; Manufacturer Part Number: 1206X226K160CT; Package Size: 1206; JLCPCB Basic Part: No; JLCPCB Part Number: C5122232; Supplier 1: LCSC; Category: Capacitors - MLCC; Supplier Part Number 1: C5122232; Temperature Coefficient: X5R; RoHS: Yes; ComponentLink1Description: Datasheet; ComponentLink1URL: https://wmsc.lcsc.com/wmsc/upload/file/pdf/v2/lcsc/2208151830_Walsin-Tech-Corp-1206X226K160CT_C5122232.pdf; ComponentLink2Description: JLCPCB Part URL; ComponentLink2URL: https://jlcpcb.com/partdetail/C5122232; ComponentLink3Description: LCSC Part URL; ComponentLink3URL: https://lcsc.com/product-detail/Multilayer-Ceramic-Capacitors-MLCC---SMD-SMT_Walsin-Tech-Corp-Walsin-Tech-Corp-1206X226K160CT_C5122232.html
footprint CAP-1206 (1206 (3216M) Capacitor)
pins: 1, 2

## 1206X226K160NT
designator C?  Capacitance: 22uF  (hidden comment: *)
Capacitor, Ceramic (MLCC), 22uF, ±10%, 16V, X5R, ±10%, SMD 1206; Manufacturer: FH(Guangdong Fenghua Advanced Tech); Manufacturer Part Number: 1206X226K160NT; Package Size: 1206; JLCPCB Basic Part: No; JLCPCB Part Number: C105480; Supplier 1: LCSC; Category: Capacitors - MLCC; Supplier Part Number 1: C105480; Tolerance: ±10%; Voltage Rating: 16V; Temperature Coefficient: X5R; RoHS: Yes; ComponentLink1Description: Datasheet; ComponentLink1URL: https://wmsc.lcsc.com/wmsc/upload/file/pdf/v2/lcsc/2304140030_FH--Guangdong-Fenghua-Advanced-Tech-1206X226K160NT_C105480.pdf; ComponentLink2Description: JLCPCB Part URL; ComponentLink2URL: https://jlcpcb.com/partdetail/C105480; ComponentLink3Description: LCSC Part URL; ComponentLink3URL: https://lcsc.com/product-detail/Multilayer-Ceramic-Capacitors-MLCC---SMD-SMT_FH-Guangdong-Fenghua-Advanced-Tech-FH-Guangdong-Fenghua-Advanced-Tech-1206X226K160NT_C105480.html
footprint CAP-1206 (1206 (3216M) Capacitor)
pins: 1, 2

## 1206X226K250CT
designator C?  Capacitance: 22uF  (hidden comment: *)
Capacitor, Ceramic (MLCC), 22uF, ±10%, 25V, X5R, ±10%, SMD 1206; Manufacturer: Walsin Tech Corp; Manufacturer Part Number: 1206X226K250CT; Package Size: 1206; JLCPCB Basic Part: No; JLCPCB Part Number: C105213; Supplier 1: LCSC; Category: Capacitors - MLCC; Supplier Part Number 1: C105213; Tolerance: ±10%; Voltage Rating: 25V; Temperature Coefficient: X5R; RoHS: Yes; ComponentLink1Description: Datasheet; ComponentLink1URL: https://wmsc.lcsc.com/wmsc/upload/file/pdf/v2/lcsc/2304140030_Walsin-Tech-Corp-1206X226K250CT_C105213.pdf; ComponentLink2Description: JLCPCB Part URL; ComponentLink2URL: https://jlcpcb.com/partdetail/C105213; ComponentLink3Description: LCSC Part URL; ComponentLink3URL: https://lcsc.com/product-detail/Multilayer-Ceramic-Capacitors-MLCC---SMD-SMT_Walsin-Tech-Corp-Walsin-Tech-Corp-1206X226K250CT_C105213.html
footprint CAP-1206 (1206 (3216M) Capacitor)
pins: 1, 2

## 1206X226K250NT_C2858004
designator C?  Capacitance: 22uF  (hidden comment: *)
Capacitor, Ceramic (MLCC), 22uF, ±10%, 25V, ±10%, SMD 1206; Manufacturer: FH (Guangdong Fenghua Advanced Tech); Manufacturer Part Number: 1206X226K250NT; Package Size: 1206; JLCPCB Basic Part: No; JLCPCB Part Number: C2858004; Supplier 1: LCSC; Category: Capacitors - MLCC; Supplier Part Number 1: C2858004; Tolerance: ±10%; Voltage Rating: 25V; RoHS: Yes; ComponentLink1Description: Datasheet; ComponentLink2Description: JLCPCB Part URL; ComponentLink2URL: https://jlcpcb.com/partdetail/C2858004; ComponentLink3Description: LCSC Part URL; ComponentLink3URL: https://lcsc.com/product-detail/Multilayer-Ceramic-Capacitors-MLCC---SMD-SMT_FH-Guangdong-Fenghua-Advanced-Tech-FH-Guangdong-Fenghua-Advanced-Tech-1206X226K250NT_C2858004.html
footprint CAP-1206 (1206 (3216M) Capacitor)
pins: 1, 2

## 1206X226K250NT_C5159774
designator C?  Capacitance: 22uF  (hidden comment: *)
Capacitor, Ceramic (MLCC), 22uF, 25V, X5R, SMD 1206; Manufacturer: FH (Guangdong Fenghua Advanced Tech); Manufacturer Part Number: 1206X226K250NT; Package Size: 1206; JLCPCB Basic Part: No; JLCPCB Part Number: C5159774; Supplier 1: LCSC; Category: Capacitors - MLCC; Supplier Part Number 1: C5159774; Voltage Rating: 25V; Temperature Coefficient: X5R; RoHS: Yes; ComponentLink1Description: Datasheet; ComponentLink1URL: https://wmsc.lcsc.com/wmsc/upload/file/pdf/v2/lcsc/2209140930_FH--Guangdong-Fenghua-Advanced-Tech-1206X226K250NT_C5159774.pdf; ComponentLink2Description: JLCPCB Part URL; ComponentLink2URL: https://jlcpcb.com/partdetail/C5159774; ComponentLink3Description: LCSC Part URL; ComponentLink3URL: https://lcsc.com/product-detail/Multilayer-Ceramic-Capacitors-MLCC---SMD-SMT_FH-Guangdong-Fenghua-Advanced-Tech-FH-Guangdong-Fenghua-Advanced-Tech-1206X226K250NT_C5159774.html
footprint CAP-1206 (1206 (3216M) Capacitor)
pins: 1, 2

## 1206X226M100NT
designator C?  Capacitance: 22uF  (hidden comment: *)
Capacitor, Ceramic (MLCC), 22uF, ±20%, 10V, X5R, ±20%, SMD 1206; Manufacturer: FH(Guangdong Fenghua Advanced Tech); Manufacturer Part Number: 1206X226M100NT; Package Size: 1206; JLCPCB Basic Part: No; JLCPCB Part Number: C108717; Supplier 1: LCSC; Category: Capacitors - MLCC; Supplier Part Number 1: C108717; Tolerance: ±20%; Voltage Rating: 10V; Temperature Coefficient: X5R; RoHS: Yes; ComponentLink1Description: Datasheet; ComponentLink1URL: https://wmsc.lcsc.com/wmsc/upload/file/pdf/v2/lcsc/2304140030_FH--Guangdong-Fenghua-Advanced-Tech-1206X226M100NT_C108717.pdf; ComponentLink2Description: JLCPCB Part URL; ComponentLink2URL: https://jlcpcb.com/partdetail/C108717; ComponentLink3Description: LCSC Part URL; ComponentLink3URL: https://lcsc.com/product-detail/Multilayer-Ceramic-Capacitors-MLCC---SMD-SMT_FH-Guangdong-Fenghua-Advanced-Tech-FH-Guangdong-Fenghua-Advanced-Tech-1206X226M100NT_C108717.html
footprint CAP-1206 (1206 (3216M) Capacitor)
pins: 1, 2

## 1206X226M160CT
designator C?  Capacitance: 22uF  (hidden comment: *)
Capacitor, Ceramic (MLCC), 22uF, ±20%, 16V, X5R, ±20%, SMD 1206; Manufacturer: Walsin Tech Corp; Manufacturer Part Number: 1206X226M160CT; Package Size: 1206; JLCPCB Basic Part: No; JLCPCB Part Number: C105214; Supplier 1: LCSC; Category: Capacitors - MLCC; Supplier Part Number 1: C105214; Tolerance: ±20%; Voltage Rating: 16V; Temperature Coefficient: X5R; RoHS: Yes; ComponentLink1Description: Datasheet; ComponentLink1URL: https://wmsc.lcsc.com/wmsc/upload/file/pdf/v2/lcsc/2304140030_Walsin-Tech-Corp-1206X226M160CT_C105214.pdf; ComponentLink2Description: JLCPCB Part URL; ComponentLink2URL: https://jlcpcb.com/partdetail/C105214; ComponentLink3Description: LCSC Part URL; ComponentLink3URL: https://lcsc.com/product-detail/Multilayer-Ceramic-Capacitors-MLCC---SMD-SMT_Walsin-Tech-Corp-Walsin-Tech-Corp-1206X226M160CT_C105214.html
footprint CAP-1206 (1206 (3216M) Capacitor)
pins: 1, 2

## 1206X226M160NT
designator C?  Capacitance: 22uF  (hidden comment: *)
Capacitor, Ceramic (MLCC), 22uF, ±20%, 16V, X5R, ±20%, SMD 1206; Manufacturer: FH(Guangdong Fenghua Advanced Tech); Manufacturer Part Number: 1206X226M160NT; Package Size: 1206; JLCPCB Basic Part: No; JLCPCB Part Number: C181046; Supplier 1: LCSC; Category: Capacitors - MLCC; Supplier Part Number 1: C181046; Tolerance: ±20%; Voltage Rating: 16V; Temperature Coefficient: X5R; RoHS: Yes; ComponentLink1Description: Datasheet; ComponentLink1URL: https://wmsc.lcsc.com/wmsc/upload/file/pdf/v2/lcsc/2304140030_FH--Guangdong-Fenghua-Advanced-Tech-1206X226M160NT_C181046.pdf; ComponentLink2Description: JLCPCB Part URL; ComponentLink2URL: https://jlcpcb.com/partdetail/C181046; ComponentLink3Description: LCSC Part URL; ComponentLink3URL: https://lcsc.com/product-detail/Multilayer-Ceramic-Capacitors-MLCC---SMD-SMT_FH-Guangdong-Fenghua-Advanced-Tech-FH-Guangdong-Fenghua-Advanced-Tech-1206X226M160NT_C181046.html
footprint CAP-1206 (1206 (3216M) Capacitor)
pins: 1, 2

## 1206X226M250CT
designator C?  Capacitance: 22uF  (hidden comment: *)
Capacitor, Ceramic (MLCC), 22uF, ±20%, 25V, X5R, ±20%, SMD 1206; Manufacturer: Walsin Tech Corp; Manufacturer Part Number: 1206X226M250CT; Package Size: 1206; JLCPCB Basic Part: No; JLCPCB Part Number: C105215; Supplier 1: LCSC; Category: Capacitors - MLCC; Supplier Part Number 1: C105215; Tolerance: ±20%; Voltage Rating: 25V; Temperature Coefficient: X5R; RoHS: Yes; ComponentLink1Description: Datasheet; ComponentLink1URL: https://wmsc.lcsc.com/wmsc/upload/file/pdf/v2/lcsc/2304140030_Walsin-Tech-Corp-1206X226M250CT_C105215.pdf; ComponentLink2Description: JLCPCB Part URL; ComponentLink2URL: https://jlcpcb.com/partdetail/C105215; ComponentLink3Description: LCSC Part URL; ComponentLink3URL: https://lcsc.com/product-detail/Multilayer-Ceramic-Capacitors-MLCC---SMD-SMT_Walsin-Tech-Corp-Walsin-Tech-Corp-1206X226M250CT_C105215.html
footprint CAP-1206 (1206 (3216M) Capacitor)
pins: 1, 2

## 1206X226M250NT_C2858005
designator C?  Capacitance: 22uF  (hidden comment: *)
Capacitor, Ceramic (MLCC), 22uF, 25V, SMD 1206; Manufacturer: FH(Guangdong Fenghua Advanced Tech); Manufacturer Part Number: 1206X226M250NT; Package Size: 1206; JLCPCB Basic Part: No; JLCPCB Part Number: C2858005; Supplier 1: LCSC; Category: Capacitors - MLCC; Supplier Part Number 1: C2858005; Voltage Rating: 25V; RoHS: Yes; ComponentLink1Description: Datasheet; ComponentLink2Description: JLCPCB Part URL; ComponentLink2URL: https://jlcpcb.com/partdetail/C2858005; ComponentLink3Description: LCSC Part URL; ComponentLink3URL: https://lcsc.com/product-detail/Multilayer-Ceramic-Capacitors-MLCC---SMD-SMT_FH-Guangdong-Fenghua-Advanced-Tech-FH-Guangdong-Fenghua-Advanced-Tech-1206X226M250NT_C2858005.html
footprint CAP-1206 (1206 (3216M) Capacitor)
pins: 1, 2

## 1206X226M250NT_C5350971
designator C?  Capacitance: 22uF  (hidden comment: *)
Capacitor, Ceramic (MLCC), 22uF, ±20%, 25V, X5R, ±20%, SMD 1206; Manufacturer: FH (Guangdong Fenghua Advanced Tech); Manufacturer Part Number: 1206X226M250NT; Package Size: 1206; JLCPCB Basic Part: No; JLCPCB Part Number: C5350971; Supplier 1: LCSC; Category: Capacitors - MLCC; Supplier Part Number 1: C5350971; Tolerance: ±20%; Voltage Rating: 25V; Temperature Coefficient: X5R; RoHS: Yes; ComponentLink1Description: Datasheet; ComponentLink2Description: JLCPCB Part URL; ComponentLink2URL: https://jlcpcb.com/partdetail/C5350971; ComponentLink3Description: LCSC Part URL; ComponentLink3URL: https://lcsc.com/product-detail/Multilayer-Ceramic-Capacitors-MLCC---SMD-SMT_FH-Guangdong-Fenghua-Advanced-Tech-FH-Guangdong-Fenghua-Advanced-Tech-1206X226M250NT_C5350971.html
footprint CAP-1206 (1206 (3216M) Capacitor)
pins: 1, 2

## 1206X475K100CT
designator C?  Capacitance: 4.7uF  (hidden comment: *)
Capacitor, Ceramic (MLCC), 4.7uF, ±10%, 10V, X5R, ±10%, SMD 1206; Manufacturer: Walsin Tech Corp; Manufacturer Part Number: 1206X475K100CT; Package Size: 1206; JLCPCB Basic Part: No; JLCPCB Part Number: C296116; Supplier 1: LCSC; Category: Capacitors - MLCC; Supplier Part Number 1: C296116; Tolerance: ±10%; Voltage Rating: 10V; Temperature Coefficient: X5R; RoHS: Yes; ComponentLink1Description: Datasheet; ComponentLink1URL: https://wmsc.lcsc.com/wmsc/upload/file/pdf/v2/lcsc/2304140030_Walsin-Tech-Corp-1206X475K100CT_C296116.pdf; ComponentLink2Description: JLCPCB Part URL; ComponentLink2URL: https://jlcpcb.com/partdetail/C296116; ComponentLink3Description: LCSC Part URL; ComponentLink3URL: https://lcsc.com/product-detail/Multilayer-Ceramic-Capacitors-MLCC---SMD-SMT_Walsin-Tech-Corp-Walsin-Tech-Corp-1206X475K100CT_C296116.html
footprint CAP-1206 (1206 (3216M) Capacitor)
pins: 1, 2

## 1206X475K100NT
designator C?  Capacitance: 4.7uF  (hidden comment: *)
Capacitor, Ceramic (MLCC), 4.7uF, ±10%, 10V, X5R, ±10%, SMD 1206; Manufacturer: FH (Guangdong Fenghua Advanced Tech); Manufacturer Part Number: 1206X475K100NT; Package Size: 1206; JLCPCB Basic Part: No; JLCPCB Part Number: C967600; Supplier 1: LCSC; Category: Capacitors - MLCC; Supplier Part Number 1: C967600; Tolerance: ±10%; Voltage Rating: 10V; Temperature Coefficient: X5R; RoHS: Yes; ComponentLink1Description: Datasheet; ComponentLink1URL: https://wmsc.lcsc.com/wmsc/upload/file/pdf/v2/lcsc/2304140030_FH--Guangdong-Fenghua-Advanced-Tech-1206X475K100NT_C967600.pdf; ComponentLink2Description: JLCPCB Part URL; ComponentLink2URL: https://jlcpcb.com/partdetail/C967600; ComponentLink3Description: LCSC Part URL; ComponentLink3URL: https://lcsc.com/product-detail/Multilayer-Ceramic-Capacitors-MLCC---SMD-SMT_FH-Guangdong-Fenghua-Advanced-Tech-FH-Guangdong-Fenghua-Advanced-Tech-1206X475K100NT_C967600.html
footprint CAP-1206 (1206 (3216M) Capacitor)
pins: 1, 2

## 1206X475K250CT
designator C?  Capacitance: 4.7uF  (hidden comment: *)
Capacitor, Ceramic (MLCC), 4.7uF, ±10%, 25V, X5R, ±10%, SMD 1206; Manufacturer: Walsin Tech Corp; Manufacturer Part Number: 1206X475K250CT; Package Size: 1206; JLCPCB Basic Part: No; JLCPCB Part Number: C2909464; Supplier 1: LCSC; Category: Capacitors - MLCC; Supplier Part Number 1: C2909464; Tolerance: ±10%; Voltage Rating: 25V; Temperature Coefficient: X5R; RoHS: Yes; ComponentLink1Description: Datasheet; ComponentLink1URL: https://wmsc.lcsc.com/wmsc/upload/file/pdf/v2/lcsc/2110272130_Walsin-Tech-Corp-1206X475K250CT_C2909464.pdf; ComponentLink2Description: JLCPCB Part URL; ComponentLink2URL: https://jlcpcb.com/partdetail/C2909464; ComponentLink3Description: LCSC Part URL; ComponentLink3URL: https://lcsc.com/product-detail/Multilayer-Ceramic-Capacitors-MLCC---SMD-SMT_Walsin-Tech-Corp-Walsin-Tech-Corp-1206X475K250CT_C2909464.html
footprint CAP-1206 (1206 (3216M) Capacitor)
pins: 1, 2

## 1206X475K500NT
designator C?  Capacitance: 4.7uF  (hidden comment: *)
Capacitor, Ceramic (MLCC), 4.7uF, ±10%, 50V, X5R, ±10%, SMD 1206; Manufacturer: FH(Guangdong Fenghua Advanced Tech); Manufacturer Part Number: 1206X475K500NT; Package Size: 1206; JLCPCB Basic Part: No; JLCPCB Part Number: C105481; Supplier 1: LCSC; Category: Capacitors - MLCC; Supplier Part Number 1: C105481; Tolerance: ±10%; Voltage Rating: 50V; Temperature Coefficient: X5R; RoHS: Yes; ComponentLink1Description: Datasheet; ComponentLink1URL: https://wmsc.lcsc.com/wmsc/upload/file/pdf/v2/lcsc/2304140030_FH--Guangdong-Fenghua-Advanced-Tech-1206X475K500NT_C105481.pdf; ComponentLink2Description: JLCPCB Part URL; ComponentLink2URL: https://jlcpcb.com/partdetail/C105481; ComponentLink3Description: LCSC Part URL; ComponentLink3URL: https://lcsc.com/product-detail/Multilayer-Ceramic-Capacitors-MLCC---SMD-SMT_FH-Guangdong-Fenghua-Advanced-Tech-FH-Guangdong-Fenghua-Advanced-Tech-1206X475K500NT_C105481.html
footprint CAP-1206 (1206 (3216M) Capacitor)
pins: 1, 2